# Altium footprint library STC12C5A60S2底板.PcbLib: 26 footprints (part 1 of 2)
Each footprint in its own frame and in the unit in brackets; x right, y up, seen from the top. Pads: shape width x height; smd on the part's side, far side on the other; paste and mask are expansions set on the pad; w line width, h text height; cw(c..) or ccw(c..) is an arc to the next point about the centre after c.
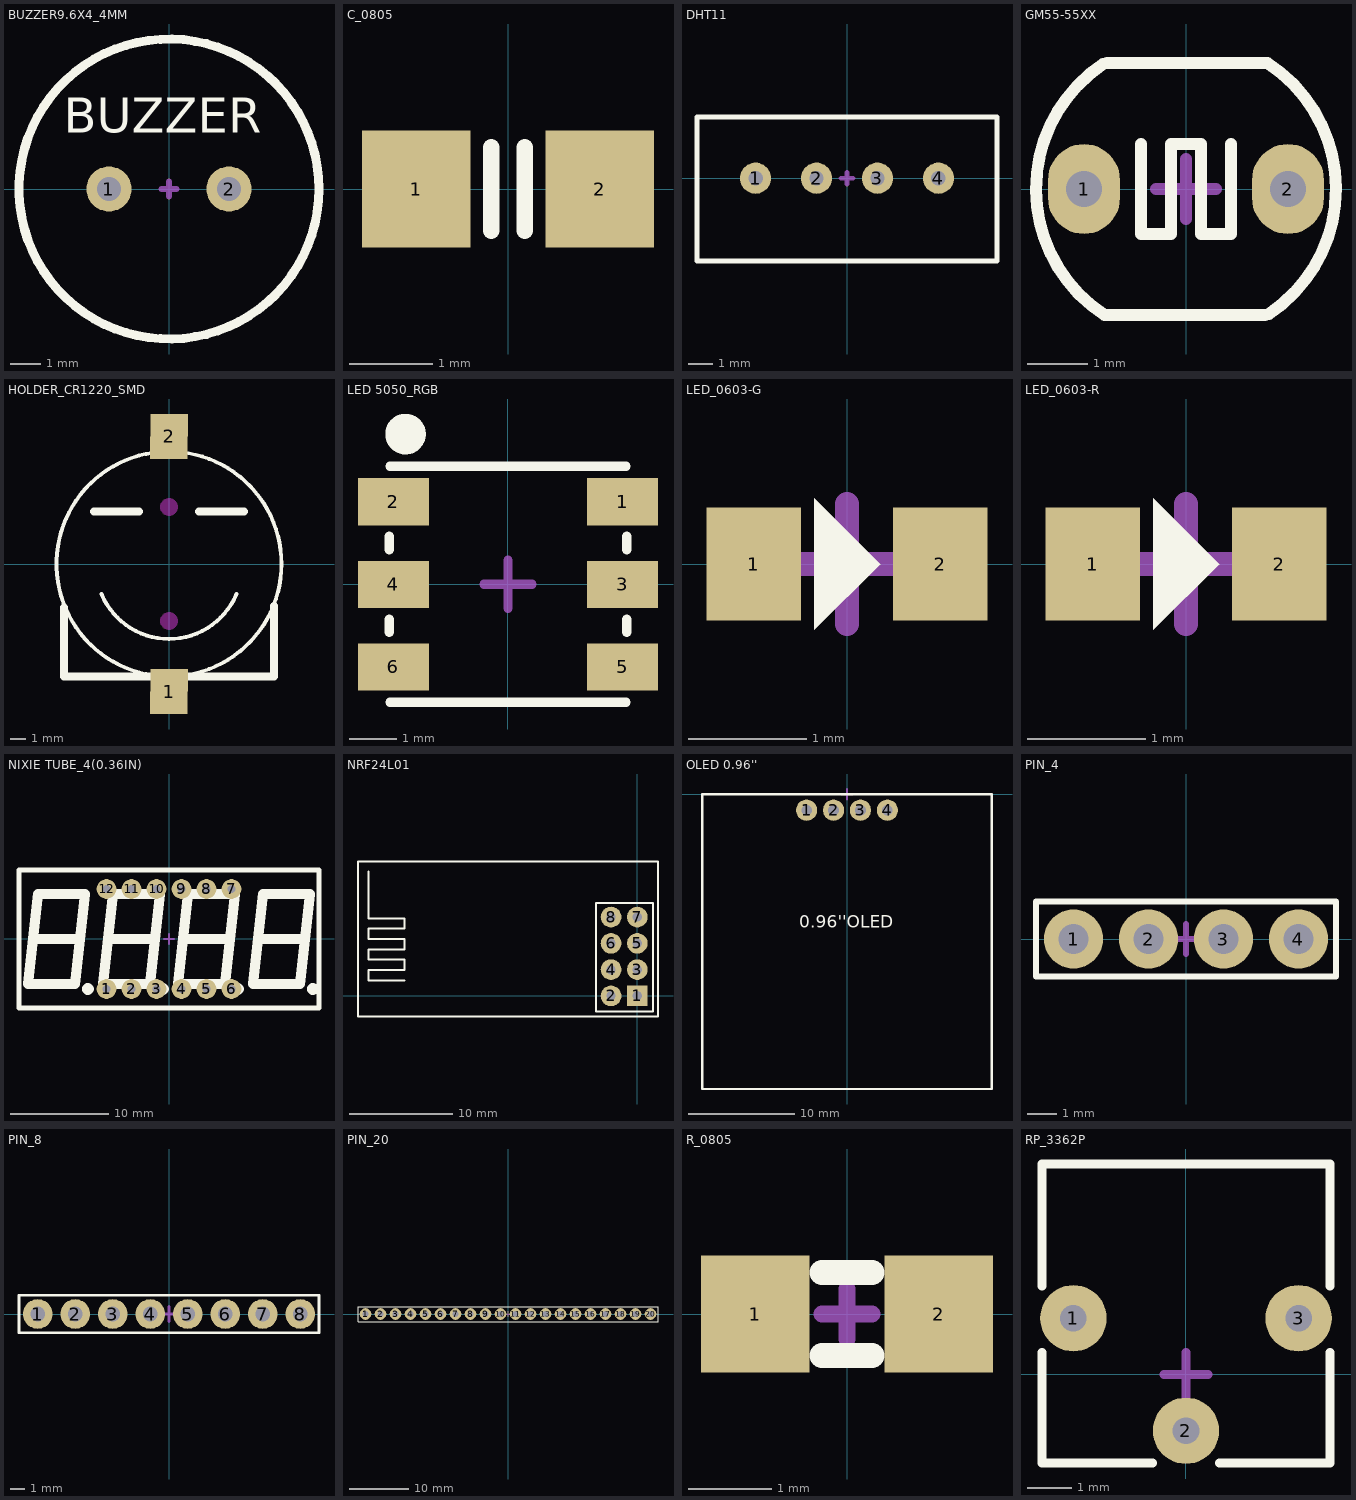
[diagram p0: the footprints below, top view; thin cyan lines are the x and y axes]

## BUZZER9.6X4_4MM [mm]
pads (2):
  round 1.5 hole 0.8: 1(-2,0) 2(2,0)
Top Overlay:
  circle w0.3: c0,0 r5
  text "BUZZER" at -3.5,1.5 h2
Mechanical 15:
  lines w0.2: -0.25,0 0.25,0 ; 0,-0.25 0,0.25

## C_0805 [mm]
height 1
pads (2):
  rect 1.3x1.4 smd: 1(-1.1,0) 2(1.1,0)
Top Overlay:
  lines w0.2: -0.2,-0.5 -0.2,0.5 ; 0.2,-0.5 0.2,0.5
3D body: height 0.78, standoff 0, extent -1,-0.625 1,0.625

## DHT11 [mm]
pads (4):
  round 1.3 hole 0.6: 1(-3.81,0) 2(-1.27,0) 3(1.27,0) 4(3.81,0)
Top Overlay:
  lines w0.2: -6.25,-3.45 -6.25,2.55 6.25,2.55 6.25,-3.45 -6.25,-3.45
Mechanical 15:
  lines w0.2: -0.25,0 0.25,0 ; 0,-0.25 0,0.25
3D body: height 16.25, standoff -7.25, extent -6,-2.8 6,2.7

## GM55-55XX [mm]
pads (2):
  oval 1.2x1.5 hole 0.6: 1(-1.7,0) 2(1.7,0)
Top Overlay:
  lines w0.2: -1.387,2.08 ccw(c0,0) -1.362,-2.096 1.316,-2.099 ; -1.316,2.1 1.362,2.1 ; -0.75,0.75 -0.75,-0.75 -0.25,-0.75 -0.25,0.75 0.25,0.75 0.25,-0.75 0.75,-0.75 0.75,0.75 ; 1.362,2.096 cw(c0,0) 1.387,-2.08
Mechanical 15:
  lines w0.2: -0.5,0 0.5,0 ; 0,-0.5 0,0.5

## HOLDER_CR1220_SMD [mm]
pads (2):
  rect 2.5x3 smd: 1(0,-8.5) 2(0,8.5)
Top Overlay:
  circle w0.254: c0,0 r7.5
  lines w0.254: -4.5,-2 ccw(c0,-0.125) 4.5,-2
  lines w0.508: -7,-2.9 -7,-7.5 7,-7.5 7,-2.8 ; -5,3.5 -2,3.5 ; 2,3.5 5,3.5
Keep-Out Layer:
  board cut-out: -0.51,-3.8 -0.471,-3.995 -0.36,-4.16 -0.195,-4.271 0,-4.31 0.195,-4.271 0.36,-4.16 0.471,-3.995 0.51,-3.8 0.471,-3.605 0.36,-3.44 0.195,-3.329 0,-3.29 -0.195,-3.329 -0.36,-3.44 -0.471,-3.605
  board cut-out: 0,3.29 -0.195,3.329 -0.36,3.44 -0.471,3.605 -0.51,3.8 -0.471,3.995 -0.36,4.16 -0.195,4.271 0,4.31 0.195,4.271 0.36,4.16 0.471,3.995 0.51,3.8 0.471,3.605 0.36,3.44 0.195,3.329
Keep-Out Layer:
  circle w0.2: c0,-3.8 r0.5
  circle w0.2: c0,3.8 r0.5
3D body: height 4.23, standoff -0.52, extent -7.349,-9.6 7.4,9.2

## LED 5050_RGB [mm]
pads (6):
  rect 1.5x1 smd: 1(2.428,1.75) 2(-2.428,1.75) 3(2.428,0) 4(-2.428,0) 5(2.428,-1.75) 6(-2.428,-1.75)
Top Overlay:
  circle w0.5: c-2.171,3.183 r0.179
  lines w0.2: -2.515,-1.016 -2.515,-0.737 ; -2.515,0.737 -2.515,1.016 ; -2.5,-2.5 2.5,-2.5 ; -2.5,2.5 2.5,2.5 ; 2.515,-1.016 2.515,-0.737 ; 2.515,0.737 2.515,1.016
Mechanical 15:
  lines w0.2: -0.508,0 0.508,0 ; 0,-0.508 0,0.508
3D body: height 1.5, standoff -0.01, extent -2.7,-2.5 2.7,2.5

## LED_0603-G [mm]
pads (2):
  rect 0.8x0.96 smd: 1(-0.79,0) 2(0.79,0)
Top Overlay:
  region: -0.279,0.559 -0.279,-0.559 0.279,0
Mechanical 15:
  lines w0.2: -0.508,0 0.508,0 ; 0,-0.508 0,0.508
3D body: height 0.9, standoff 0, extent -0.85,-0.45 0.85,0.45

## LED_0603-R [mm]
pads (2):
  rect 0.8x0.96 smd: 1(-0.79,0) 2(0.79,0)
Top Overlay:
  region: -0.279,0.559 -0.279,-0.559 0.279,0
Mechanical 15:
  lines w0.2: -0.508,0 0.508,0 ; 0,-0.508 0,0.508
3D body: height 0.9, standoff 0, extent -0.85,-0.45 0.85,0.45

## NIXIE TUBE_4(0.36IN) [mm]
pads (12):
  round 2 hole 0.8: 1(-6.35,-5.08) 2(-3.81,-5.08) 3(-1.27,-5.08) 4(1.27,-5.08) 5(3.81,-5.08) 6(6.35,-5.08) 7(6.35,5.08) 8(3.81,5.08) 9(1.27,5.08) 10(-1.27,5.08) 11(-3.81,5.08) 12(-6.35,5.08)
Top Overlay:
  circle w1.016: c-0.622,-5.08 r0.089
  circle w1.016: c-8.242,-5.08 r0.089
  circle w1.016: c6.998,-5.08 r0.089
  circle w1.016: c14.618,-5.08 r0.089
  lines w0.5: -15.24,-7 -15.24,7 15.24,7 15.24,-7 -15.24,-7
  lines w1: -13.83,0 -9.03,0 ; -6.21,0 -1.41,0 ; 1.41,0 6.21,0 ; 9.03,0 13.83,0 ; -14.338,-4.572 -9.538,-4.572 -8.522,4.572 -13.322,4.572 -14.338,-4.572 ; -6.718,-4.572 -1.918,-4.572 -0.902,4.572 -5.702,4.572 -6.718,-4.572 ; 0.902,-4.572 5.702,-4.572 6.718,4.572 1.918,4.572 0.902,-4.572 ; 8.522,-4.572 13.322,-4.572 14.338,4.572 9.538,4.572 8.522,-4.572
Mechanical 15:
  lines w0.2: -0.508,0 0.508,0 ; 0,-0.508 0,0.508
3D body: height 7.21, standoff -2.49, extent -15.24,-7 15.24,7

## NRF24L01 [mm]
pads (8):
  rect 2x2 hole 0.9: 1(0,0)
  round 2 hole 0.9: 2(-2.54,0) 3(0,2.54) 4(-2.54,2.54) 5(0,5.08) 6(-2.54,5.08) 7(0,7.62) 8(-2.54,7.62)
Top Overlay:
  lines w0.2: -26,12 -26,7.5 -22.5,7.5 -22.5,6.5 -26,6.5 -26,5.5 -22.5,5.5 -22.5,4.5 -26,4.5 -26,3.5 -22.5,3.5 -22.5,2.5 -26,2.5 -26,1.5 -22.5,1.5 ; -27,-2 2,-2 2,13 -27,13 -27,-2 ; -4,-1.5 1.5,-1.5 1.5,9 -4,9 -4,-1.5
3D body: height 15, standoff 0.09, extent -27.25,-2 1.75,13

## OLED 0.96'' [mm]
pads (4):
  round 2 hole 1: 1(-3.81,-1.5) 2(-1.27,-1.5) 3(1.27,-1.5) 4(3.81,-1.5)
Top Overlay:
  lines w0.2: -13.65,-27.8 -13.65,0 13.65,0 13.65,-27.8 -13.65,-27.8
  text "0.96''OLED" at -4.5,-13 h2
Mechanical 15:
  lines w0.2: -0.5,0 0.5,0 ; 0,-0.5 0,0.5

## PIN_4 [mm]
pads (4):
  round 2 hole 1: 1(-3.81,0) 2(-1.27,0) 3(1.27,0) 4(3.81,0)
Top Overlay:
  lines w0.2: -5.08,-1.27 -5.08,1.27 5.08,1.27 5.08,-1.27 -5.08,-1.27
Mechanical 15:
  lines w0.2: -0.508,0 0.508,0 ; 0,-0.508 0,0.508
3D body: height 8.51, standoff -2.99, extent -5.08,-1.27 -2.54,1.27
3D body: height 8.51, standoff -2.99, extent -2.54,-1.27 0,1.27
3D body: height 8.51, standoff -2.99, extent 0,-1.27 2.54,1.27
3D body: height 8.51, standoff -2.99, extent 2.54,-1.27 5.08,1.27

## PIN_8 [mm]
pads (8):
  round 2 hole 1: 1(-8.89,0) 2(-6.35,0) 3(-3.81,0) 4(-1.27,0) 5(1.27,0) 6(3.81,0) 7(6.35,0) 8(8.89,0)
Top Overlay:
  lines w0.2: -10.16,-1.27 -10.16,1.27 10.16,1.27 10.16,-1.27 -10.16,-1.27
Mechanical 15:
  lines w0.2: -0.508,0 0.508,0 ; 0,-0.508 0,0.508
3D body: height 8.51, standoff -2.99, extent 7.62,-1.27 10.16,1.27
3D body: height 8.51, standoff -2.99, extent 5.08,-1.27 7.62,1.27
3D body: height 8.51, standoff -2.99, extent 2.54,-1.27 5.08,1.27
3D body: height 8.51, standoff -2.99, extent 0,-1.27 2.54,1.27
3D body: height 8.51, standoff -2.99, extent -2.54,-1.27 0,1.27
3D body: height 8.51, standoff -2.99, extent -5.08,-1.27 -2.54,1.27
3D body: height 8.51, standoff -2.99, extent -7.62,-1.27 -5.08,1.27
3D body: height 8.51, standoff -2.99, extent -10.16,-1.27 -7.62,1.27

## PIN_20 [mm]
pads (20):
  round 2 hole 1: 1(-24.13,0) 2(-21.59,0) 3(-19.05,0) 4(-16.51,0) 5(-13.97,0) 6(-11.43,0) 7(-8.89,0) 8(-6.35,0) 9(-3.81,0) 10(-1.27,0) 11(1.27,0) 12(3.81,0) 13(6.35,0) 14(8.89,0) 15(11.43,0) 16(13.97,0) 17(16.51,0) 18(19.05,0) 19(21.59,0) 20(24.13,0)
Top Overlay:
  lines w0.2: -25.4,-1.27 25.4,-1.27 25.4,1.27 -25.4,1.27 -25.4,-1.27
Mechanical 15:
  lines w0.2: -0.508,0 0.508,0 ; 0,-0.508 0,0.508
3D body: height 8.51, standoff -2.99, extent 22.86,-1.27 25.4,1.27
3D body: height 8.51, standoff -2.99, extent 20.32,-1.27 22.86,1.27
3D body: height 8.51, standoff -2.99, extent 17.78,-1.27 20.32,1.27
3D body: height 8.51, standoff -2.99, extent 15.24,-1.27 17.78,1.27
3D body: height 8.51, standoff -2.99, extent -25.4,-1.27 -22.86,1.27
3D body: height 8.51, standoff -2.99, extent -22.86,-1.27 -20.32,1.27
3D body: height 8.51, standoff -2.99, extent -20.32,-1.27 -17.78,1.27
3D body: height 8.51, standoff -2.99, extent -17.78,-1.27 -15.24,1.27
3D body: height 8.51, standoff -2.99, extent -15.24,-1.27 -12.7,1.27
3D body: height 8.51, standoff -2.99, extent -12.7,-1.27 -10.16,1.27
3D body: height 8.51, standoff -2.99, extent -10.16,-1.27 -7.62,1.27
3D body: height 8.51, standoff -2.99, extent -7.62,-1.27 -5.08,1.27
3D body: height 8.51, standoff -2.99, extent -5.08,-1.27 -2.54,1.27
3D body: height 8.51, standoff -2.99, extent -2.54,-1.27 0,1.27
3D body: height 8.51, standoff -2.99, extent 0,-1.27 2.54,1.27
3D body: height 8.51, standoff -2.99, extent 2.54,-1.27 5.08,1.27
3D body: height 8.51, standoff -2.99, extent 5.08,-1.27 7.62,1.27
3D body: height 8.51, standoff -2.99, extent 7.62,-1.27 10.16,1.27
3D body: height 8.51, standoff -2.99, extent 10.16,-1.27 12.7,1.27
3D body: height 8.51, standoff -2.99, extent 12.7,-1.27 15.24,1.27

## R_0805 [mm]
pads (2):
  rect 1.3x1.4 smd: 1(-1.1,0) 2(1.1,0)
Top Overlay:
  lines w0.3: -0.3,-0.5 0.3,-0.5 ; -0.3,0.5 0.3,0.5
Mechanical 15:
  lines w0.2: -0.3,0 0.3,0 ; 0,-0.3 0,0.3
3D body: height 0.76, standoff 0, extent -1.15,-0.675 1.15,0.675

## RP_3362P [mm]
pads (3):
  round 1.5 hole 0.6: 1(-2.54,1.27) 2(0,-1.27) 3(2.54,1.27)
Top Overlay:
  lines w0.2: -3.25,0.5 -3.25,-2 -0.75,-2 ; -3.25,2 -3.25,4.75 3.25,4.75 3.25,2 ; 0.75,-2 3.25,-2 3.25,0.5
Mechanical 15:
  lines w0.2: -0.5,0 0.5,0 ; 0,-0.5 0,0.5
3D body: height 4.34, standoff -5.82, extent -3.353,-2.2 3.353,4.836